# Altium footprint library ConnectorsTDH.PcbLib: 194 footprints (part 8 of 13)
Each footprint in its own frame and in the unit in brackets; x right, y up, seen from the top. Pads: shape width x height; smd on the part's side, far side on the other; paste and mask are expansions set on the pad; w line width, h text height; cw(c..) or ccw(c..) is an arc to the next point about the centre after c.
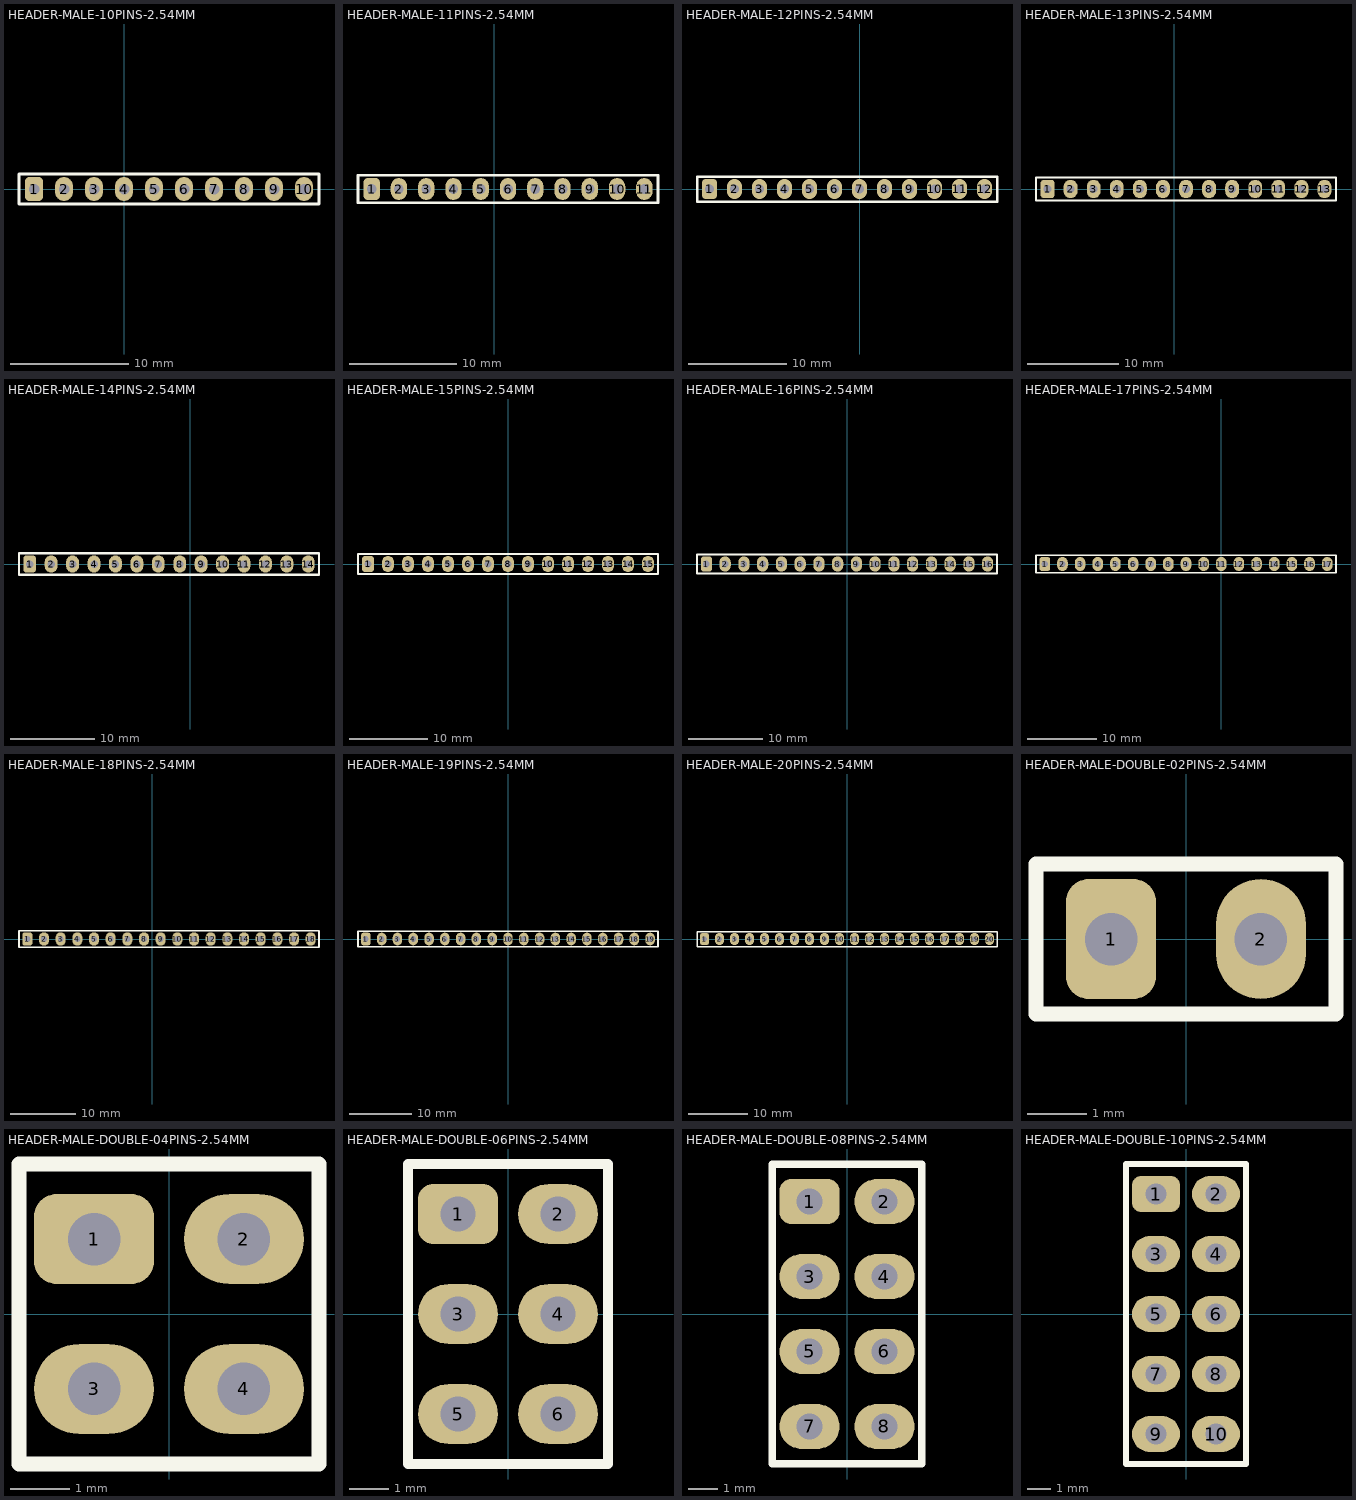
[diagram p7: the footprints below, top view; thin cyan lines are the x and y axes]

## HEADER-MALE-10PINS-2.54MM [mil]
pads (10):
  rrect50% 60x80 hole 35: 1(-300,0)
  oval 60x80 hole 35: 2(-200,0) 3(-100,0) 4(0,0) 5(100,0) 6(200,0) 7(300,0) 8(400,0) 9(500,0) 10(600,0)
Top Overlay:
  lines w10: -350,-50 -350,50 650,50 650,-50 -350,-50
3D body "10-Pin Header - Male - 2.54mm.step": height 350, standoff -120, extent -350,-50 650,50

## HEADER-MALE-11PINS-2.54MM [mil]
pads (11):
  rrect50% 60x80 hole 35: 1(-450,0)
  oval 60x80 hole 35: 2(-350,0) 3(-250,0) 4(-150,0) 5(-50,0) 6(50,0) 7(150,0) 8(250,0) 9(350,0) 10(450,0) 11(550,0)
Top Overlay:
  lines w10: -500,-50 -500,50 600,50 600,-50 -500,-50
3D body "11-Pin Header - Male - 2.54mm.step": height 350, standoff -120, extent -499.99,-49.99 600.01,50.01

## HEADER-MALE-12PINS-2.54MM [mil]
pads (12):
  rrect50% 60x80 hole 35: 1(-600,0)
  oval 60x80 hole 35: 2(-500,0) 3(-400,0) 4(-300,0) 5(-200,0) 6(-100,0) 7(0,0) 8(100,0) 9(200,0) 10(300,0) 11(400,0) 12(500,0)
Top Overlay:
  lines w10: -650,-50 -650,50 550,50 550,-50 -650,-50
3D body "12-Pin Header - Male - 2.54mm.step": height 350, standoff -120, extent -649.99,-49.99 550.01,50.01

## HEADER-MALE-13PINS-2.54MM [mil]
pads (13):
  rrect50% 60x80 hole 35: 1(-550,0)
  oval 60x80 hole 35: 2(-450,0) 3(-350,0) 4(-250,0) 5(-150,0) 6(-50,0) 7(50,0) 8(150,0) 9(250,0) 10(350,0) 11(450,0) 12(550,0) 13(650,0)
Top Overlay:
  lines w10: -591.82,50 -600,50 ; -600,50 -600,-50 700,-50 700,50 -600,50
3D body "13-Pin Header - Male - 2.54mm.step": height 350, standoff -120, extent -599.99,-49.99 700.01,50.01

## HEADER-MALE-14PINS-2.54MM [mil]
pads (14):
  rrect50% 60x80 hole 35: 1(-750,0)
  oval 60x80 hole 35: 2(-650,0) 3(-550,0) 4(-450,0) 5(-350,0) 6(-250,0) 7(-150,0) 8(-50,0) 9(50,0) 10(150,0) 11(250,0) 12(350,0) 13(450,0) 14(550,0)
Top Overlay:
  lines w10: -800,-50 -800,50 600,50 600,-50 -800,-50
3D body "14-Pin Header - Male - 2.54mm.step": height 350, standoff -120, extent -799.99,-49.99 600.01,50.01

## HEADER-MALE-15PINS-2.54MM [mil]
pads (15):
  rrect50% 60x80 hole 35: 1(-700,0)
  oval 60x80 hole 35: 2(-600,0) 3(-500,0) 4(-400,0) 5(-300,0) 6(-200,0) 7(-100,0) 8(0,0) 9(100,0) 10(200,0) 11(300,0) 12(400,0) 13(500,0) 14(600,0) 15(700,0)
Top Overlay:
  lines w10: -750,-50 -750,50 750,50 750,-50 -750,-50
3D body "15-Pin Header - Male - 2.54mm.step": height 350, standoff -120, extent -750,-50 750,50

## HEADER-MALE-16PINS-2.54MM [mil]
pads (16):
  rrect50% 60x80 hole 35: 1(-750,0)
  oval 60x80 hole 35: 2(-650,0) 3(-550,0) 4(-450,0) 5(-350,0) 6(-250,0) 7(-150,0) 8(-50,0) 9(50,0) 10(150,0) 11(250,0) 12(350,0) 13(450,0) 14(550,0) 15(650,0) 16(750,0)
Top Overlay:
  lines w10: -800,-50 -800,50 800,50 800,-50 -800,-50
3D body "16-Pin Header - Male - 2.54mm.step": height 350, standoff -120, extent -799.99,-49.99 800.01,50.01

## HEADER-MALE-17PINS-2.54MM [mil]
pads (17):
  rrect50% 60x80 hole 35: 1(-1000,0)
  oval 60x80 hole 35: 2(-900,0) 3(-800,0) 4(-700,0) 5(-600,0) 6(-500,0) 7(-400,0) 8(-300,0) 9(-200,0) 10(-100,0) 11(0,0) 12(100,0) 13(200,0) 14(300,0) 15(400,0) 16(500,0) 17(600,0)
Top Overlay:
  lines w10: -1050,-50 650,-50 650,50 -1050,50 -1050,-50
3D body "17-Pin Header - Male - 2.54mm.step": height 350, standoff -120, extent -1049.99,-49.99 650.01,50.01

## HEADER-MALE-18PINS-2.54MM [mil]
pads (18):
  rrect50% 60x80 hole 35: 1(-750,0)
  oval 60x80 hole 35: 2(-650,0) 3(-550,0) 4(-450,0) 5(-350,0) 6(-250,0) 7(-150,0) 8(-50,0) 9(50,0) 10(150,0) 11(250,0) 12(350,0) 13(450,0) 14(550,0) 15(650,0) 16(750,0) 17(850,0) 18(950,0)
Top Overlay:
  lines w10: -800,-50 -800,50 1000,50 1000,-50 -800,-50
3D body "18-Pin Header - Male - 2.54mm.step": height 350, standoff -120, extent -799.99,-49.99 1000.01,50.01

## HEADER-MALE-19PINS-2.54MM [mil]
pads (19):
  rrect50% 60x80 hole 35: 1(-900,0)
  oval 60x80 hole 35: 2(-800,0) 3(-700,0) 4(-600,0) 5(-500,0) 6(-400,0) 7(-300,0) 8(-200,0) 9(-100,0) 10(0,0) 11(100,0) 12(200,0) 13(300,0) 14(400,0) 15(500,0) 16(600,0) 17(700,0) 18(800,0) 19(900,0)
Top Overlay:
  lines w10: -950,-50 -950,50 950,50 950,-50 -950,-50
3D body "19-Pin Header - Male - 2.54mm.step": height 350, standoff -120, extent -949.99,-49.99 950.01,50.01

## HEADER-MALE-20PINS-2.54MM [mil]
pads (20):
  rrect50% 60x80 hole 35: 1(-950,0)
  oval 60x80 hole 35: 2(-850,0) 3(-750,0) 4(-650,0) 5(-550,0) 6(-450,0) 7(-350,0) 8(-250,0) 9(-150,0) 10(-50,0) 11(50,0) 12(150,0) 13(250,0) 14(350,0) 15(450,0) 16(550,0) 17(650,0) 18(750,0) 19(850,0) 20(950,0)
Top Overlay:
  lines w10: -1000,-50 1000,-50 1000,50 -1000,50 -1000,-50
3D body "20-Pin Header - Male - 2.54mm.step": height 350, standoff -120, extent -999.99,-49.99 1000.01,50.01

## HEADER-MALE-DOUBLE-02PINS-2.54MM [mil]
pads (2):
  rrect50% 60x80 hole 35: 1(-50,0)
  oval 60x80 hole 35: 2(50,0)
Top Overlay:
  lines w10: -100,-50 -100,50 100,50 100,-50 -100,-50
3D body "2-Pin Header - Male - Double - 2.54mm.step": height 350, standoff -120, extent -100,-49.99 100,50.01

## HEADER-MALE-DOUBLE-04PINS-2.54MM [mil]
pads (4):
  rrect50% 80x60 hole 35: 1(-50,50)
  oval 80x60 hole 35: 2(50,50) 3(-50,-50) 4(50,-50)
Top Overlay:
  lines w10: -100,-100 -100,100 100,100 100,-100 -100,-100
3D body "4-Pin Header - Male - Double - 2.54mm.step": height 350, standoff -120, extent -100,-99.99 100,100.01

## HEADER-MALE-DOUBLE-06PINS-2.54MM [mil]
pads (6):
  rrect50% 80x60 hole 35: 1(-50,100)
  oval 80x60 hole 35: 2(50,100) 3(-50,0) 4(50,0) 5(-50,-100) 6(50,-100)
Top Overlay:
  lines w10: -100,-150 100,-150 100,150 -100,150 -100,-150
3D body "6-Pin Header - Male - Double - 2.54mm.step": height 350, standoff -120, extent -100,-149.99 100,150.01

## HEADER-MALE-DOUBLE-08PINS-2.54MM [mil]
pads (8):
  rrect50% 80x60 hole 35: 1(-50,150)
  oval 80x60 hole 35: 2(50,150) 3(-50,50) 4(50,50) 5(-50,-50) 6(50,-50) 7(-50,-150) 8(50,-150)
Top Overlay:
  lines w10: -100,-200 -100,200 100,200 100,-200 -100,-200
3D body "8-Pin Header - Male - Double - 2.54mm.step": height 350, standoff -120, extent -100,-199.99 100,200.01

## HEADER-MALE-DOUBLE-10PINS-2.54MM [mil]
pads (10):
  rrect50% 80x60 hole 35: 1(-50,200)
  oval 80x60 hole 35: 2(50,200) 3(-50,100) 4(50,100) 5(-50,0) 6(50,0) 7(-50,-100) 8(50,-100) 9(-50,-200) 10(50,-200)
Top Overlay:
  lines w10: -100,-250 100,-250 100,250 -100,250 -100,-250
3D body "10-Pin Header - Male - Double - 2.54mm.step": height 350, standoff -120, extent -100,-249.99 100,250.01